# Altium footprint library Mfd3PcbLib.PcbLib: 32 footprints (part 2 of 2)
Each footprint in its own frame and in the unit in brackets; x right, y up, seen from the top. Pads: shape width x height; smd on the part's side, far side on the other; paste and mask are expansions set on the pad; w line width, h text height; cw(c..) or ccw(c..) is an arc to the next point about the centre after c.
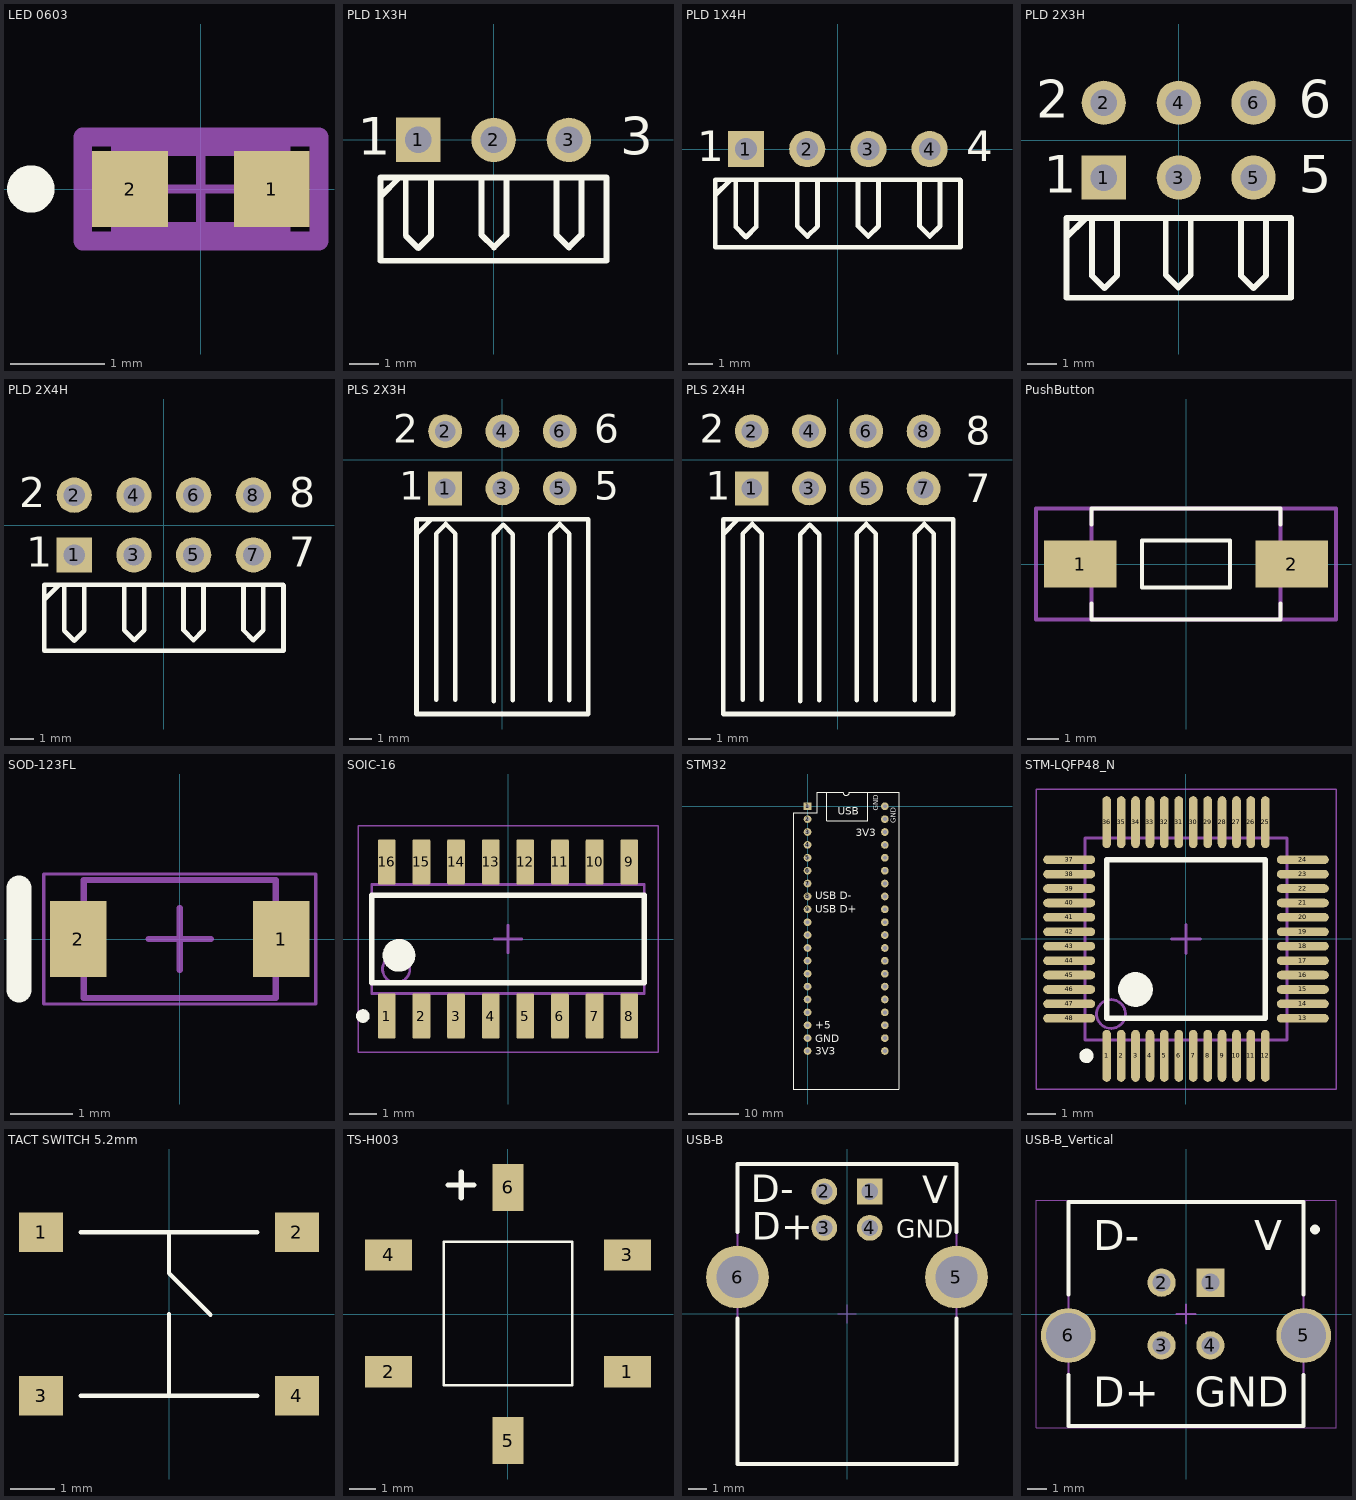
[diagram p1: the footprints below, top view; thin cyan lines are the x and y axes]

## LED 0603 [mm]
pads (2):
  rect 0.8x0.8 smd paste+0 mask+0: 1(0.75,0) 2(-0.75,0)
Top Overlay:
  circle w0.25: c-1.8,0 r0.125
Mechanical 5:
  lines w0.2: -1.25,-0.55 -1.25,0.55 1.25,0.55 1.25,-0.55 -1.25,-0.55
  text ".Designator" at 0,0 h1
Mechanical 13:
  lines w0.2: -0.85,-0.45 -0.85,0.45 0.85,0.45 0.85,-0.45 -0.85,-0.45
Mechanical 15:
  lines w0.2: -1.25,-0.55 -1.25,0.55 1.25,0.55 1.25,-0.55 -1.25,-0.55
Mechanical 16:
  lines w0.1: -0.5,0 0.5,0 ; 0,-0.5 0,0.5
3D body "Diode_Lite-On_LTST-C190GKT_eec.STEP": height 0.25, standoff 0, extent -1.25,-0.55 1.25,0.55

## PLD 1X3H [mm] "Connector; Header; 3x1 Position; Right Angle"
pads (3):
  rect 1.5x1.5 hole 0.9: 1(-2.54,0)
  round 1.5 hole 0.9: 2(0,0) 3(2.54,0)
Top Overlay:
  lines w0.2: -3.81,-1.905 -3.175,-1.27 ; -2.963,-1.3 -2.963,-3.227 -2.54,-3.65 -2.117,-3.227 -2.117,-1.3 ; -0.413,-1.275 -0.413,-3.202 0.01,-3.625 0.433,-3.202 0.433,-1.275 ; 2.112,-1.275 2.112,-3.202 2.535,-3.625 2.958,-3.202 2.958,-1.275 ; -3.815,-4.075 -3.815,-1.27 3.81,-1.27 3.81,-4.075 -3.815,-4.075
  text "3" at 4.27,-0.508 h1.27
  text "1" at -4.572,-0.508 h1.27
3D body "PinHeader_1x03_P2.54mm_Horizontal.step.step": height 2.54, standoff -3, extent -3.81,-10.04 3.81,0.32

## PLD 1X4H [mm] "Connector; Header; 4x2 Position; Right Angle"
pads (4):
  rect 1.5x1.5 hole 0.9: 1(-3.81,0)
  round 1.5 hole 0.9: 2(-1.27,0) 3(1.27,0) 4(3.81,0)
Top Overlay:
  lines w0.2: -5.08,-1.905 -4.445,-1.27 ; -4.233,-1.3 -4.233,-3.227 -3.81,-3.65 -3.387,-3.227 -3.387,-1.3 ; -1.683,-1.275 -1.683,-3.202 -1.26,-3.625 -0.837,-3.202 -0.837,-1.275 ; 0.842,-1.275 0.842,-3.202 1.265,-3.625 1.688,-3.202 1.688,-1.275 ; 3.392,-1.275 3.392,-3.202 3.815,-3.625 4.238,-3.202 4.238,-1.275 ; 5.08,-1.27 -5.085,-1.27 -5.085,-4.075 5.09,-4.075 5.09,-1.3
  text "1" at -5.842,-0.508 h1.27
  text "4" at 5.334,-0.508 h1.27
3D body "PinHeader_1x04_P2.54mm_Horizontal.step": height 2.54, standoff -3, extent -5.08,-10.04 5.08,0.32

## PLD 2X3H [mm] "Connector; Header; 3x2 Position; Right Angle"
pads (6):
  rect 1.5x1.5 hole 0.9: 1(-2.54,-1.27)
  round 1.5 hole 0.9: 2(-2.54,1.27) 3(0,-1.27) 4(0,1.27) 5(2.54,-1.27) 6(2.54,1.27)
Top Overlay:
  lines w0.2: -3.81,-3.3 -3.175,-2.665 ; -2.938,-4.597 -2.938,-2.67 ; -2.938,-4.597 -2.515,-5.02 -2.092,-4.597 -2.092,-2.67 ; -0.438,-2.645 -0.438,-4.572 -0.015,-4.995 0.408,-4.572 0.408,-2.645 ; 2.112,-4.597 2.112,-2.67 ; 2.112,-4.597 2.535,-5.02 2.958,-4.597 2.958,-2.67 ; -3.81,-5.345 3.81,-5.345 3.81,-2.645 -3.81,-2.645 -3.81,-5.345
  text "2" at -4.84,0.762 h1.27
  text "1" at -4.572,-1.778 h1.27
  text "5" at 4.064,-1.778 h1.27
  text "6" at 4.064,0.762 h1.27
3D body "PinHeader_2x03_P2.54mm_Horizontal.step": height 5.08, standoff -3, extent -3.81,-11.32 3.81,1.58

## PLD 2X4H [mm] "Connector; Header; 4x2 Position; Right Angle"
pads (8):
  rect 1.5x1.5 hole 0.9: 1(-3.81,-1.27)
  round 1.5 hole 0.9: 2(-3.81,1.27) 3(-1.27,-1.27) 4(-1.27,1.27) 5(1.27,-1.27) 6(1.27,1.27) 7(3.81,-1.27) 8(3.81,1.27)
Top Overlay:
  lines w0.2: -5.08,-3.175 -4.445,-2.54 ; -4.233,-2.57 -4.233,-4.497 -3.81,-4.92 -3.387,-4.497 -3.387,-2.57 ; -1.683,-2.545 -1.683,-4.472 -1.26,-4.895 -0.837,-4.472 -0.837,-2.545 ; 0.842,-2.545 0.842,-4.472 1.265,-4.895 1.688,-4.472 1.688,-2.545 ; 3.392,-2.545 3.392,-4.472 3.815,-4.895 4.238,-4.472 4.238,-2.545 ; 5.08,-2.54 -5.085,-2.54 -5.085,-5.345 5.09,-5.345 5.09,-2.57
  text "2" at -6.16,0.755 h1.27
  text "1" at -5.842,-1.778 h1.27
  text "7" at 5.334,-1.778 h1.27
  text "8" at 5.334,0.762 h1.27
3D body "PinHeader_2x04_P2.54mm_Horizontal.step": height 5.08, standoff -3, extent -5.08,-11.31 5.08,1.59

## PLS 2X3H [mm] "Connector; Header; 3x2 Position; Right Angle"
pads (6):
  rect 1.5x1.5 hole 0.9: 1(-2.54,-1.27)
  round 1.5 hole 0.9: 2(-2.54,1.27) 3(0,-1.27) 4(0,1.27) 5(2.54,-1.27) 6(2.54,1.27)
Top Overlay:
  lines w0.2: -3.81,-3.3 -3.175,-2.665 ; -2.938,-10.645 -2.938,-3.268 -2.515,-2.845 -2.092,-3.268 ; -2.088,-10.645 -2.088,-3.268 ; -0.388,-10.695 -0.388,-3.318 ; -0.388,-3.293 0.035,-2.87 0.458,-3.293 ; 0.462,-10.67 0.462,-3.293 ; 2.112,-10.67 2.112,-3.293 ; 2.112,-3.268 2.535,-2.845 2.958,-3.268 ; 2.962,-10.67 2.962,-3.293 ; -3.81,-11.27 3.81,-11.27 3.81,-2.645 -3.81,-2.645 -3.81,-11.27
  text "2" at -4.84,0.762 h1.27
  text "1" at -4.572,-1.778 h1.27
  text "5" at 4.064,-1.778 h1.27
  text "6" at 4.064,0.762 h1.27
3D body "PinSocket_2x03_P2.54mm_Horizontal.step": height 5.08, standoff -2.9, extent -3.81,-11.3 3.81,1.37

## PLS 2X4H [mm] "Connector; Header; 3x2 Position; Right Angle"
pads (8):
  rect 1.5x1.5 hole 0.9: 1(-3.81,-1.27)
  round 1.5 hole 0.9: 2(-3.81,1.27) 3(-1.27,-1.27) 4(-1.27,1.27) 5(1.27,-1.27) 6(1.27,1.27) 7(3.81,-1.27) 8(3.81,1.27)
Top Overlay:
  lines w0.2: -5.08,-3.3 -4.445,-2.665 ; -4.208,-10.645 -4.208,-3.268 -3.785,-2.845 -3.362,-3.268 ; -3.358,-10.645 -3.358,-3.268 ; -1.658,-10.695 -1.658,-3.318 ; -1.658,-3.293 -1.235,-2.87 -0.812,-3.293 ; -0.808,-10.67 -0.808,-3.293 ; 0.842,-10.67 0.842,-3.293 ; 0.842,-3.268 1.265,-2.845 1.688,-3.268 ; 1.692,-10.67 1.692,-3.293 ; 3.417,-10.67 3.417,-3.293 ; 3.417,-3.268 3.84,-2.845 4.263,-3.268 ; 4.267,-10.67 4.267,-3.293 ; -5.08,-11.27 -5.08,-2.645 5.115,-2.645 5.115,-11.27 -5.08,-11.27
  text "8" at 5.669,0.662 h1.27
  text "7" at 5.669,-1.878 h1.27
  text "1" at -5.842,-1.778 h1.27
  text "2" at -6.11,0.762 h1.27
3D body "PinSocket_2x04_P2.54mm_Horizontal.step": height 5.08, standoff -2.9, extent -5.08,-11.3 5.08,1.37

## PushButton [mm] "6.0*3.5mm vertical type, SMD, height 5.0mm, black actuator, 160gf, T&R"
height 5
pads (2):
  rect 2.3x1.5 smd: 1(-3.35,0) 2(3.35,0)
Top Overlay:
  lines w0.127: -3,-1.25 -3,-1.75 ; -3,1.25 -3,1.75 3,1.75 ; 3,-1.25 3,-1.75 -3,-1.75 ; 3,1.25 3,1.75 ; -3,-1.75 -3,-1.75 ; 3,1.75 3,1.75 ; -1.4,-0.75 1.4,-0.75 1.4,0.75 -1.4,0.75 -1.4,-0.75
Mechanical 13:
  lines w0.127: -3,-1.75 -3,1.75 3,1.75 3,-1.75 -3,-1.75
Mechanical 15:
  lines w0.127: -4.75,-1.75 4.75,-1.75 4.75,1.75 -4.75,1.75 -4.75,-1.75
3D body "4341x10508x6.stp": height 5, standoff 0, extent -4,-1.75 4,1.75

## SOD-123FL [mil] "SODFL, 2-Leads, Body 3.1x1.9mm"
height 47.24
pads (2):
  rect 36x48 smd: 1(64.5,0) 2(-64.5,0)
Top Overlay:
  lines w15.75: -102.17,-32.48 -102.17,32.48
Mechanical 13:
  lines w3.94: -61.02,-37.4 -61.02,37.4 61.02,37.4 61.02,-37.4 -61.02,-37.4
Mechanical 15:
  lines w1.97: -86.44,-41.34 -86.44,41.34 86.44,41.34 86.44,-41.34 -86.44,-41.34
  lines w3.94: -19.68,0 19.68,0 ; 0,-19.68 0,19.68
3D body "SODFL370X120-2L.step": height 47.24, standoff 0, extent -72.83,-37.4 72.83,37.4

## SOIC-16 [mm] "SOIC, 16-Leads, Body 10x4mm, Pitch 1.27mm, IPC Low Density"
height 1.75
pads (16):
  rrect15% 0.65x1.65 smd: 1(-4.445,-2.825) 2(-3.175,-2.825) 3(-1.905,-2.825) 4(-0.635,-2.825) 5(0.635,-2.825) 6(1.905,-2.825) 7(3.175,-2.825) 8(4.445,-2.825) 9(4.445,2.825) 10(3.175,2.825) 11(1.905,2.825) 12(0.635,2.825) 13(-0.635,2.825) 14(-1.905,2.825) 15(-3.175,2.825) 16(-4.445,2.825)
Top Overlay:
  circle w0.25: c-5.32,-2.825 r0.125
  circle w0.6: c-4,-0.6 r0.3
  lines w0.2: -5,-1.6 5,-1.6 5,1.6 -5,1.6 -5,-1.6
Mechanical 1:
  text ".Designator" at 1.575,0.35 h0.8
Mechanical 13:
  circle w0.1: c-4.1,-1.1 r0.5
  lines w0.1: -5,-2 5,-2 5,2 -5,2 -5,-2
Mechanical 15:
  lines w0.05: -5.5,-4.15 5.5,-4.15 5.5,4.15 -5.5,4.15 -5.5,-4.15
  lines w0.1: -0.5,0 0.5,0 ; 0,-0.5 0,0.5
3D body "SOIC-16akaD0016AakaM16A.stp": height 1.59, standoff -0.01, extent -4.953,-2.997 4.953,2.997

## STM32 [mil]
pads (40):
  rect 60x60 hole 30: 1(0,0)
  round 60 hole 30: 2(0,-100) 3(0,-200) 4(0,-300) 5(0,-400) 6(0,-500) 7(0,-600) 8(0,-700) 9(0,-800) 10(0,-900) 11(0,-1000) 12(0,-1100) 13(0,-1200) 14(0,-1300) 15(0,-1400) 16(0,-1500) 17(0,-1600) 18(0,-1700) 19(0,-1800) 20(0,-1900) 21(600,-1900) 22(600,-1800) 23(600,-1700) 24(600,-1600) 25(600,-1500) 26(600,-1400) 27(600,-1300) 28(600,-1200) 29(600,-1100) 30(600,-1000) 31(600,-900) 32(600,-800) 33(600,-700) 34(600,-600) 35(600,-500) 36(600,-400) 37(600,-300) 38(600,-200) 39(600,-100) 40(600,0)
Top Overlay:
  lines w7.87: 76,108 76,-50.4 -113,-50.4 -113,-2195 707,-2195 707,109.06 325,109.06 cw(c300,109.06) 275,109.06 76,109.06 ; 150,109 150,-111 467,-111 467,109
  text "USB" at 233,-67 h60
  text "3V3" at 60,-1931 h60
  text "GND" at 60,-1831 h60
  text "+5" at 60,-1729 h60
  text "3V3" at 374,-232 h60
  text "USB D-" at 60,-722 h60
  text "USB D+" at 60,-826 h60
  text "GND" at 550,-35 h39.37
  text "GND" at 686,-132 h39.37
3D body "User Library-BluePill2.X_T": height 453.15, standoff -233.11, extent -143,-2196.99 742.83,111.53

## STM-LQFP48_N [mm] "QFP, 48-Leads, Body 7x7mm, Pitch 0.5mm, IPC Medium Density"
height 1.6
pads (48):
  oval 0.3x1.8 smd: 1(-2.75,-4.05) 2(-2.25,-4.05) 3(-1.75,-4.05) 4(-1.25,-4.05) 5(-0.75,-4.05) 6(-0.25,-4.05) 7(0.25,-4.05) 8(0.75,-4.05) 9(1.25,-4.05) 10(1.75,-4.05) 11(2.25,-4.05) 12(2.75,-4.05) 25(2.75,4.05) 26(2.25,4.05) 27(1.75,4.05) 28(1.25,4.05) 29(0.75,4.05) 30(0.25,4.05) 31(-0.25,4.05) 32(-0.75,4.05) 33(-1.25,4.05) 34(-1.75,4.05) 35(-2.25,4.05) 36(-2.75,4.05)
  oval 1.8x0.3 smd: 13(4.05,-2.75) 14(4.05,-2.25) 15(4.05,-1.75) 16(4.05,-1.25) 17(4.05,-0.75) 18(4.05,-0.25) 19(4.05,0.25) 20(4.05,0.75) 21(4.05,1.25) 22(4.05,1.75) 23(4.05,2.25) 24(4.05,2.75) 37(-4.05,2.75) 38(-4.05,2.25) 39(-4.05,1.75) 40(-4.05,1.25) 41(-4.05,0.75) 42(-4.05,0.25) 43(-4.05,-0.25) 44(-4.05,-0.75) 45(-4.05,-1.25) 46(-4.05,-1.75) 47(-4.05,-2.25) 48(-4.05,-2.75)
Top Overlay:
  circle w0.25: c-3.45,-4.05 r0.125
  circle w0.6: c-1.75,-1.75 r0.3
  lines w0.2: -2.75,-2.75 2.75,-2.75 2.75,2.75 -2.75,2.75 -2.75,-2.75
Mechanical 13:
  circle w0.1: c-2.6,-2.6 r0.5
  lines w0.1: -3.5,-3.5 3.5,-3.5 3.5,3.5 -3.5,3.5 -3.5,-3.5
Mechanical 15:
  lines w0.05: -5.2,-5.2 5.2,-5.2 5.2,5.2 -5.2,5.2 -5.2,-5.2
  lines w0.1: -0.5,0 0.5,0 ; 0,-0.5 0,0.5
3D body: height 1.6, standoff 0.05, extent -3.5,-3.5 3.5,3.5

## TACT SWITCH 5.2mm [mm]
pads (4):
  rect 1x0.9 smd: 1(-2.9,1.85) 2(2.9,1.85) 3(-2.9,-1.85) 4(2.9,-1.85)
Top Overlay:
  lines w0.1: -2,-1.85 2,-1.85 ; -2,1.85 2,1.85 ; 0,-1.85 0,0 ; 0,1.85 0,0.925 0.94,-0.015
3D body "Tactile_SMD_5x5mm.STEP": height 1.52, standoff 0, extent -3.25,-2.54 3.25,2.54

## TS-H003 [mm]
pads (6):
  rect 1.8x1.2 smd: 1(4.6,-2.225) 2(-4.6,-2.225) 3(4.6,2.275) 4(-4.6,2.275)
  rect 1.2x1.8 smd: 5(0,-4.875) 6(0,4.875)
Top Overlay:
  lines w0.1: -2.47,2.775 -2.47,-2.745 2.46,-2.745 ; -2.47,2.785 2.47,2.785 2.47,-2.745
  lines w0.2: -2.303,4.97 -1.303,4.97 ; -1.803,4.47 -1.803,5.47
3D body "test-3d v1.step": height 7.8, standoff 0, extent -4.977,-5.007 5.023,4.993

## USB-B [mm] "USB 2.0 Type B Horizontal"
height 11.05
pads (6):
  rect 1.42x1.42 hole 0.92: 1(1.25,6.74)
  round 1.42 hole 0.92: 2(-1.25,6.74) 3(-1.25,4.74) 4(1.25,4.74)
  round 3.45 hole 2.3: 5(6.02,2.03) 6(-6.02,2.03)
Top Overlay:
  lines w0.2: -6.02,-0.25 -6.02,-8.25 6.02,-8.25 6.02,-0.25 ; -6.02,4.5 -6.02,8.25 6.02,8.25 6.02,4.5
  text "GND" at 2.704,4.204 h1
  text "D+" at -5.246,4.079 h1.52
  text "D-" at -5.296,6.154 h1.52
  text "V" at 4.129,6.079 h1.52
Mechanical 13:
  lines w0.1: -6.02,-8.25 -6.02,8.25 6.02,8.25 6.02,-8.25 -6.02,-8.25
Mechanical 15:
  lines w0.05: -0.5,0 0.5,0 ; 0,-0.5 0,0.5
3D body "61400416121.stp": height 11.08, standoff -3.78, extent -7.484,-8.25 7.484,8.25

## USB-B_Vertical [mm] "THD, 4-Leads, Body 12.03x11.46mm, Pitch 2.5mm"
height 15.62
pads (6):
  rect 1.45x1.45 hole 0.92: 1(1.25,1.605)
  round 1.45 hole 0.92: 2(-1.25,1.605) 3(-1.25,-1.605) 4(1.25,-1.605)
  round 2.8 hole 2.3: 5(6.02,-1.1) 6(-6.02,-1.1)
Top Overlay:
  circle w0.25: c6.6,4.325 r0.125
  lines w0.2: -6.015,-3.13 -6.015,-5.73 6.015,-5.73 6.015,-3.13 ; -6.015,1 -6.015,5.73 6.015,5.73 6.015,1
  text "V" at 3.501,3.254 h1.52
  text "D-" at -4.746,3.254 h1.52
  text "D+" at -4.746,-4.746 h1.52
  text "GND" at 0.454,-4.746 h1.52
Mechanical 13:
  lines w0.1: -6.015,-5.73 6.015,-5.73 6.015,5.73 -6.015,5.73 -6.015,-5.73
Mechanical 15:
  lines w0.05: -7.675,-5.83 -7.675,5.83 7.675,5.83 7.675,-5.83 -7.675,-5.83
  lines w0.1: -0.5,0 0.5,0 ; 0,-0.5 0,0.5
3D body "c-5787834-1-1-3d.stp": height 15.62, standoff -3.92, extent -7.575,-5.728 7.575,5.728